# Altium footprint library ICL_komponenty_v1.PcbLib: 160 footprints (part 5 of 10) (continued)
## LQFP100_A001 [mm] "TSQFP, 100-Leads, Body 14,00x14,00mm, Pitch 0,50mm, IPC Low Density" (continued)
  region: -0.4,-7 -0.6,-7 -0.6,-8 -0.4,-8
  region: -0.9,-7 -1.1,-7 -1.1,-8 -0.9,-8
  region: -1.4,-7 -1.6,-7 -1.6,-8 -1.4,-8
  region: -1.9,-7 -2.1,-7 -2.1,-8 -1.9,-8
  region: -2.4,-7 -2.6,-7 -2.6,-8 -2.4,-8
  region: -2.9,-7 -3.1,-7 -3.1,-8 -2.9,-8
  region: -3.4,-7 -3.6,-7 -3.6,-8 -3.4,-8
  region: -3.9,-7 -4.1,-7 -4.1,-8 -3.9,-8
  region: -4.4,-7 -4.6,-7 -4.6,-8 -4.4,-8
  region: -4.9,-7 -5.1,-7 -5.1,-8 -4.9,-8
  region: -5.4,-7 -5.6,-7 -5.6,-8 -5.4,-8
  region: -5.9,-7 -6.1,-7 -6.1,-8 -5.9,-8
  region: -7,-6.1 -7,-5.9 -8,-5.9 -8,-6.1
  region: -7,-5.6 -7,-5.4 -8,-5.4 -8,-5.6
  region: -7,-5.1 -7,-4.9 -8,-4.9 -8,-5.1
  region: -7,-4.6 -7,-4.4 -8,-4.4 -8,-4.6
  region: -7,-4.1 -7,-3.9 -8,-3.9 -8,-4.1
  region: -7,-3.6 -7,-3.4 -8,-3.4 -8,-3.6
  region: -7,-3.1 -7,-2.9 -8,-2.9 -8,-3.1
  region: -7,-2.6 -7,-2.4 -8,-2.4 -8,-2.6
  region: -7,-2.1 -7,-1.9 -8,-1.9 -8,-2.1
  region: -7,-1.6 -7,-1.4 -8,-1.4 -8,-1.6
  region: -7,-1.1 -7,-0.9 -8,-0.9 -8,-1.1
  region: -7,-0.6 -7,-0.4 -8,-0.4 -8,-0.6
  region: -7,-0.1 -7,0.1 -8,0.1 -8,-0.1
  region: -7,0.4 -7,0.6 -8,0.6 -8,0.4
  region: -7,0.9 -7,1.1 -8,1.1 -8,0.9
  region: -7,1.4 -7,1.6 -8,1.6 -8,1.4
  region: -7,1.9 -7,2.1 -8,2.1 -8,1.9
  region: -7,2.4 -7,2.6 -8,2.6 -8,2.4
  region: -7,2.9 -7,3.1 -8,3.1 -8,2.9
  region: -7,3.4 -7,3.6 -8,3.6 -8,3.4
  region: -7,3.9 -7,4.1 -8,4.1 -8,3.9
  region: -7,4.4 -7,4.6 -8,4.6 -8,4.4
  region: -7,4.9 -7,5.1 -8,5.1 -8,4.9
  region: -7,5.4 -7,5.6 -8,5.6 -8,5.4
  region: -7,5.9 -7,6.1 -8,6.1 -8,5.9
  lines w0.2: -7,-7 7,-7 7,7 -7,7 -7,-7
Top M13-14_SDES:
  text "'.Designator'" at -8.497,-0.625 h1.5
Top M15-16_SORG:
  lines w0.1: -0.5,0 0.5,0 ; 0,-0.5 0,0.5 ; -9.15,-9.15 9.15,-9.15 9.15,9.15 -9.15,9.15 -9.15,-9.15
3D body "LQFP100_A001.step": height 1.6, standoff 0, extent -8,-8 8,8

## LQFP176 [mm]
height 1.6
pads (176):
  oval 1.5x0.3 smd: 1(-12.8,10.75) 2(-12.8,10.25) 3(-12.8,9.75) 4(-12.8,9.25) 5(-12.8,8.75) 6(-12.8,8.25) 7(-12.8,7.75) 8(-12.8,7.25) 9(-12.8,6.75) 10(-12.8,6.25) 11(-12.8,5.75) 12(-12.8,5.25) 13(-12.8,4.75) 14(-12.8,4.25) 15(-12.8,3.75) 16(-12.8,3.25) 17(-12.8,2.75) 18(-12.8,2.25) 19(-12.8,1.75) 20(-12.8,1.25) 21(-12.8,0.75) 22(-12.8,0.25) 23(-12.8,-0.25) 24(-12.8,-0.75) 25(-12.8,-1.25) 26(-12.8,-1.75) 27(-12.8,-2.25) 28(-12.8,-2.75) 29(-12.8,-3.25) 30(-12.8,-3.75) 31(-12.8,-4.25) 32(-12.8,-4.75) 33(-12.8,-5.25) 34(-12.8,-5.75) 35(-12.8,-6.25) 36(-12.8,-6.75) 37(-12.8,-7.25) 38(-12.8,-7.75) 39(-12.8,-8.25) 40(-12.8,-8.75) 41(-12.8,-9.25) 42(-12.8,-9.75) 43(-12.8,-10.25) 44(-12.8,-10.75) 89(12.8,-10.75) 90(12.8,-10.25) 91(12.8,-9.75) 92(12.8,-9.25) 93(12.8,-8.75) 94(12.8,-8.25) 95(12.8,-7.75) 96(12.8,-7.25) 97(12.8,-6.75) 98(12.8,-6.25) 99(12.8,-5.75) 100(12.8,-5.25) 101(12.8,-4.75) 102(12.8,-4.25) 103(12.8,-3.75) 104(12.8,-3.25) 105(12.8,-2.75) 106(12.8,-2.25) 107(12.8,-1.75) 108(12.8,-1.25) 109(12.8,-0.75) 110(12.8,-0.25) 111(12.8,0.25) 112(12.8,0.75) 113(12.8,1.25) 114(12.8,1.75) 115(12.8,2.25) 116(12.8,2.75) 117(12.8,3.25) 118(12.8,3.75) 119(12.8,4.25) 120(12.8,4.75) 121(12.8,5.25) 122(12.8,5.75) 123(12.8,6.25) 124(12.8,6.75) 125(12.8,7.25) 126(12.8,7.75) 127(12.8,8.25) 128(12.8,8.75) 129(12.8,9.25) 130(12.8,9.75) 131(12.8,10.25) 132(12.8,10.75)
  oval 0.3x1.5 smd: 45(-10.75,-12.8) 46(-10.25,-12.8) 47(-9.75,-12.8) 48(-9.25,-12.8) 49(-8.75,-12.8) 50(-8.25,-12.8) 51(-7.75,-12.8) 52(-7.25,-12.8) 53(-6.75,-12.8) 54(-6.25,-12.8) 55(-5.75,-12.8) 56(-5.25,-12.8) 57(-4.75,-12.8) 58(-4.25,-12.8) 59(-3.75,-12.8) 60(-3.25,-12.8) 61(-2.75,-12.8) 62(-2.25,-12.8) 63(-1.75,-12.8) 64(-1.25,-12.8) 65(-0.75,-12.8) 66(-0.25,-12.8) 67(0.25,-12.8) 68(0.75,-12.8) 69(1.25,-12.8) 70(1.75,-12.8) 71(2.25,-12.8) 72(2.75,-12.8) 73(3.25,-12.8) 74(3.75,-12.8) 75(4.25,-12.8) 76(4.75,-12.8) 77(5.25,-12.8) 78(5.75,-12.8) 79(6.25,-12.8) 80(6.75,-12.8) 81(7.25,-12.8) 82(7.75,-12.8) 83(8.25,-12.8) 84(8.75,-12.8) 85(9.25,-12.8) 86(9.75,-12.8) 87(10.25,-12.8) 88(10.75,-12.8) 133(10.75,12.8) 134(10.25,12.8) 135(9.75,12.8) 136(9.25,12.8) 137(8.75,12.8) 138(8.25,12.8) 139(7.75,12.8) 140(7.25,12.8) 141(6.75,12.8) 142(6.25,12.8) 143(5.75,12.8) 144(5.25,12.8) 145(4.75,12.8) 146(4.25,12.8) 147(3.75,12.8) 148(3.25,12.8) 149(2.75,12.8) 150(2.25,12.8) 151(1.75,12.8) 152(1.25,12.8) 153(0.75,12.8) 154(0.25,12.8) 155(-0.25,12.8) 156(-0.75,12.8) 157(-1.25,12.8) 158(-1.75,12.8) 159(-2.25,12.8) 160(-2.75,12.8) 161(-3.25,12.8) 162(-3.75,12.8) 163(-4.25,12.8) 164(-4.75,12.8) 165(-5.25,12.8) 166(-5.75,12.8) 167(-6.25,12.8) 168(-6.75,12.8) 169(-7.25,12.8) 170(-7.75,12.8) 171(-8.25,12.8) 172(-8.75,12.8) 173(-9.25,12.8) 174(-9.75,12.8) 175(-10.25,12.8) 176(-10.75,12.8)
Top Overlay:
  circle w0.25: c-12.8,11.45 r0.125
  circle w0.6: c-10.6,10.6 r0.3
  lines w0.2: -11.6,-11.6 -11.6,11.6 11.6,11.6 11.6,-11.6 -11.6,-11.6
Mechanical 3:
  lines w0.2: -1.7,0 0,0 ; 0,-1.7 0,0 ; 0,1.7 0,0 ; 1.7,0 0,0
Top M11-12_SMOT:
  drawing of 182 lines, arcs and shapes, not listed
Top M13-14_SDES:
  text "'.Designator'" at -11.33,-0.833 h2
Top M15-16_SORG:
  lines w0.05: -14.1,-14.1 -14.1,14.1 14.1,14.1 14.1,-14.1 -14.1,-14.1
  lines w0.1: -0.5,0 0.5,0 ; 0,-0.5 0,0.5
3D body "LQFP176_B.step": height 1.6, standoff 0, extent -13,-13 13,13

## LQFP-80 [mm] "TSQFP, 80-Leads, Body 12.00x12.00mm, Pitch 0.50mm, IPC Low Density"
height 1.2
pads (80):
  oval 1.6x0.35 smd: 1(-6.7,4.75) 2(-6.7,4.25) 3(-6.7,3.75) 4(-6.7,3.25) 5(-6.7,2.75) 6(-6.7,2.25) 7(-6.7,1.75) 8(-6.7,1.25) 9(-6.7,0.75) 10(-6.7,0.25) 11(-6.7,-0.25) 12(-6.7,-0.75) 13(-6.7,-1.25) 14(-6.7,-1.75) 15(-6.7,-2.25) 16(-6.7,-2.75) 17(-6.7,-3.25) 18(-6.7,-3.75) 19(-6.7,-4.25) 20(-6.7,-4.75) 41(6.7,-4.75) 42(6.7,-4.25) 43(6.7,-3.75) 44(6.7,-3.25) 45(6.7,-2.75) 46(6.7,-2.25) 47(6.7,-1.75) 48(6.7,-1.25) 49(6.7,-0.75) 50(6.7,-0.25) 51(6.7,0.25) 52(6.7,0.75) 53(6.7,1.25) 54(6.7,1.75) 55(6.7,2.25) 56(6.7,2.75) 57(6.7,3.25) 58(6.7,3.75) 59(6.7,4.25) 60(6.7,4.75)
  oval 0.35x1.6 smd: 21(-4.75,-6.7) 22(-4.25,-6.7) 23(-3.75,-6.7) 24(-3.25,-6.7) 25(-2.75,-6.7) 26(-2.25,-6.7) 27(-1.75,-6.7) 28(-1.25,-6.7) 29(-0.75,-6.7) 30(-0.25,-6.7) 31(0.25,-6.7) 32(0.75,-6.7) 33(1.25,-6.7) 34(1.75,-6.7) 35(2.25,-6.7) 36(2.75,-6.7) 37(3.25,-6.7) 38(3.75,-6.7) 39(4.25,-6.7) 40(4.75,-6.7) 61(4.75,6.7) 62(4.25,6.7) 63(3.75,6.7) 64(3.25,6.7) 65(2.75,6.7) 66(2.25,6.7) 67(1.75,6.7) 68(1.25,6.7) 69(0.75,6.7) 70(0.25,6.7) 71(-0.25,6.7) 72(-0.75,6.7) 73(-1.25,6.7) 74(-1.75,6.7) 75(-2.25,6.7) 76(-2.75,6.7) 77(-3.25,6.7) 78(-3.75,6.7) 79(-4.25,6.7) 80(-4.75,6.7)
Top Overlay:
  circle w0.25: c-6.7,5.475 r0.125
  lines w0.2: -5.6,-5.6 -5.6,5.6 5.6,5.6 5.6,-5.6 -5.6,-5.6
Top M11-12_SMOT:
  circle w0.6: c-4.6,4.6 r0.3
  rectangle: -4.9,5.8 -4.6,7
  rectangle: -4.4,5.8 -4.1,7
  rectangle: -3.9,5.8 -3.6,7
  rectangle: -3.4,5.8 -3.1,7
  rectangle: -2.9,5.8 -2.6,7
  rectangle: -2.4,5.8 -2.1,7
  rectangle: -1.9,5.8 -1.6,7
  rectangle: -1.4,5.8 -1.1,7
  rectangle: -0.9,5.8 -0.6,7
  rectangle: -0.4,5.8 -0.1,7
  rectangle: 0.1,5.8 0.4,7
  rectangle: 0.6,5.8 0.9,7
  rectangle: 1.1,5.8 1.4,7
  rectangle: 1.6,5.8 1.9,7
  rectangle: 2.1,5.8 2.4,7
  rectangle: 2.6,5.8 2.9,7
  rectangle: 3.1,5.8 3.4,7
  rectangle: 3.6,5.8 3.9,7
  rectangle: 4.1,5.8 4.4,7
  rectangle: 4.6,5.8 4.9,7
  region: -5.8,-4.9 -5.8,-4.6 -7,-4.6 -7,-4.9
  region: -5.8,-4.4 -5.8,-4.1 -7,-4.1 -7,-4.4
  region: -5.8,-3.9 -5.8,-3.6 -7,-3.6 -7,-3.9
  region: -5.8,-3.4 -5.8,-3.1 -7,-3.1 -7,-3.4
  region: -5.8,-2.9 -5.8,-2.6 -7,-2.6 -7,-2.9
  region: -5.8,-2.4 -5.8,-2.1 -7,-2.1 -7,-2.4
  region: -5.8,-1.9 -5.8,-1.6 -7,-1.6 -7,-1.9
  region: -5.8,-1.4 -5.8,-1.1 -7,-1.1 -7,-1.4
  region: -5.8,-0.9 -5.8,-0.6 -7,-0.6 -7,-0.9
  region: -5.8,-0.4 -5.8,-0.1 -7,-0.1 -7,-0.4
  region: -5.8,0.1 -5.8,0.4 -7,0.4 -7,0.1
  region: -5.8,0.6 -5.8,0.9 -7,0.9 -7,0.6
  region: -5.8,1.1 -5.8,1.4 -7,1.4 -7,1.1
  region: -5.8,1.6 -5.8,1.9 -7,1.9 -7,1.6
  region: -5.8,2.1 -5.8,2.4 -7,2.4 -7,2.1
  region: -5.8,2.6 -5.8,2.9 -7,2.9 -7,2.6
  region: -5.8,3.1 -5.8,3.4 -7,3.4 -7,3.1
  region: -5.8,3.6 -5.8,3.9 -7,3.9 -7,3.6
  region: -5.8,4.1 -5.8,4.4 -7,4.4 -7,4.1
  region: -5.8,4.6 -5.8,4.9 -7,4.9 -7,4.6
  region: 4.9,-5.8 4.6,-5.8 4.6,-7 4.9,-7
  region: 4.4,-5.8 4.1,-5.8 4.1,-7 4.4,-7
  region: 3.9,-5.8 3.6,-5.8 3.6,-7 3.9,-7
  region: 3.4,-5.8 3.1,-5.8 3.1,-7 3.4,-7
  region: 2.9,-5.8 2.6,-5.8 2.6,-7 2.9,-7
  region: 2.4,-5.8 2.1,-5.8 2.1,-7 2.4,-7
  region: 1.9,-5.8 1.6,-5.8 1.6,-7 1.9,-7
  region: 1.4,-5.8 1.1,-5.8 1.1,-7 1.4,-7
  region: 0.9,-5.8 0.6,-5.8 0.6,-7 0.9,-7
  region: 0.4,-5.8 0.1,-5.8 0.1,-7 0.4,-7
  region: -0.1,-5.8 -0.4,-5.8 -0.4,-7 -0.1,-7
  region: -0.6,-5.8 -0.9,-5.8 -0.9,-7 -0.6,-7
  region: -1.1,-5.8 -1.4,-5.8 -1.4,-7 -1.1,-7
  region: -1.6,-5.8 -1.9,-5.8 -1.9,-7 -1.6,-7
  region: -2.1,-5.8 -2.4,-5.8 -2.4,-7 -2.1,-7
  region: -2.6,-5.8 -2.9,-5.8 -2.9,-7 -2.6,-7
  region: -3.1,-5.8 -3.4,-5.8 -3.4,-7 -3.1,-7
  region: -3.6,-5.8 -3.9,-5.8 -3.9,-7 -3.6,-7
  region: -4.1,-5.8 -4.4,-5.8 -4.4,-7 -4.1,-7
  region: -4.6,-5.8 -4.9,-5.8 -4.9,-7 -4.6,-7
  region: 5.8,4.9 5.8,4.6 7,4.6 7,4.9
  region: 5.8,4.4 5.8,4.1 7,4.1 7,4.4
  region: 5.8,3.9 5.8,3.6 7,3.6 7,3.9
  region: 5.8,3.4 5.8,3.1 7,3.1 7,3.4
  region: 5.8,2.9 5.8,2.6 7,2.6 7,2.9
  region: 5.8,2.4 5.8,2.1 7,2.1 7,2.4
  region: 5.8,1.9 5.8,1.6 7,1.6 7,1.9
  region: 5.8,1.4 5.8,1.1 7,1.1 7,1.4
  region: 5.8,0.9 5.8,0.6 7,0.6 7,0.9
  region: 5.8,0.4 5.8,0.1 7,0.1 7,0.4
  region: 5.8,-0.1 5.8,-0.4 7,-0.4 7,-0.1
  region: 5.8,-0.6 5.8,-0.9 7,-0.9 7,-0.6
  region: 5.8,-1.1 5.8,-1.4 7,-1.4 7,-1.1
  region: 5.8,-1.6 5.8,-1.9 7,-1.9 7,-1.6
  region: 5.8,-2.1 5.8,-2.4 7,-2.4 7,-2.1
  region: 5.8,-2.6 5.8,-2.9 7,-2.9 7,-2.6
  region: 5.8,-3.1 5.8,-3.4 7,-3.4 7,-3.1
  region: 5.8,-3.6 5.8,-3.9 7,-3.9 7,-3.6
  region: 5.8,-4.1 5.8,-4.4 7,-4.4 7,-4.1
  region: 5.8,-4.6 5.8,-4.9 7,-4.9 7,-4.6
  lines w0.2: -5.8,-5.8 5.8,-5.8 5.8,5.8 -5.8,5.8 -5.8,-5.8
Top M13-14_SDES:
  text "'.Designator'" at -7.931,-0.583 h1.4
Top M15-16_SORG:
  lines w0.05: -7.7,-7.7 -7.7,7.7 7.7,7.7 7.7,-7.7 -7.7,-7.7
  lines w0.1: -0.5,0 0.5,0 ; 0,-0.5 0,0.5
3D body "TSQFP80.step": height 1.2, standoff 0, extent -7,-7 7,7

## M66 [mm]
pads (44):
  rect 2.5x0.7 smd mask+0.1: 1(-7.65,6.6) 2(-7.65,5.5) 3(-7.65,4.4) 4(-7.65,3.3) 5(-7.65,2.2) 6(-7.65,1.1) 7(-7.65,0) 8(-7.65,-1.1) 9(-7.65,-2.2) 10(-7.65,-3.3) 11(-7.65,-4.4) 12(-7.65,-5.5) 13(-7.65,-6.6) 23(7.65,-6.6) 24(7.65,-5.5) 25(7.65,-4.4) 26(7.65,-3.3) 27(7.65,-2.2) 28(7.65,-1.1) 29(7.65,0) 30(7.65,1.1) 31(7.65,2.2) 32(7.65,3.3) 33(7.65,4.4) 34(7.65,5.5) 35(7.65,6.6)
  rect 0.7x2.5 smd mask+0.1: 14(-4.4,-8.6) 15(-3.3,-8.6) 16(-2.2,-8.6) 17(-1.1,-8.6) 18(0,-8.6) 19(1.1,-8.6) 20(2.2,-8.6) 21(3.3,-8.6) 22(4.4,-8.6) 36(4.4,8.6) 37(3.3,8.6) 38(2.2,8.6) 39(1.1,8.6) 40(0,8.6) 41(-1.1,8.6) 42(-2.2,8.6) 43(-3.3,8.6) 44(-4.4,8.6)
Top Layer keep-out:
  circle w0.254: c4.25,5.15 r1.75
  circle w0.254: c4.25,-3.45 r1.75
Top Overlay:
  circle w0.6: c-9,8.8 r0.3
  lines w0.2: -7.9,-8 -7.9,-8.9 -7,-8.9 ; -7.9,8 -7.9,8.9 -7,8.9 ; 7,-8.9 7.9,-8.9 7.9,-8 ; 7,8.9 7.9,8.9 7.9,8
Top M11-12_SMOT:
  circle w0.6: c-6.55,8 r0.4
  region: -6.6,-6.3 -8,-6.3 -8,-6.9 -6.6,-6.9
  region: -6.6,-5.2 -8,-5.2 -8,-5.8 -6.6,-5.8
  region: -6.6,-4.1 -8,-4.1 -8,-4.7 -6.6,-4.7
  region: -6.6,-3 -8,-3 -8,-3.6 -6.6,-3.6
  region: -6.6,-0.8 -8,-0.8 -8,-1.4 -6.6,-1.4
  region: -6.6,1.4 -8,1.4 -8,0.8 -6.6,0.8
  region: -6.6,3.6 -8,3.6 -8,3 -6.6,3
  region: -6.6,4.7 -8,4.7 -8,4.1 -6.6,4.1
  region: -6.6,5.8 -8,5.8 -8,5.2 -6.6,5.2
  region: -6.6,6.9 -8,6.9 -8,6.3 -6.6,6.3
  rectangle: 6.6,-6.9 8,-6.3
  rectangle: 6.6,-4.7 8,-4.1
  rectangle: 6.6,-5.8 8,-5.2
  rectangle: 6.6,-3.6 8,-3
  rectangle: 6.6,-1.4 8,-0.8
  rectangle: 6.6,0.8 8,1.4
  rectangle: 6.6,3 8,3.6
  rectangle: 6.6,5.2 8,5.8
  rectangle: 6.6,4.1 8,4.7
  rectangle: 6.6,6.3 8,6.9
  region: -6.6,-1.9 -8,-1.9 -8,-2.5 -6.6,-2.5
  region: -6.6,0.3 -8,0.3 -8,-0.3 -6.6,-0.3
  region: -6.6,2.5 -8,2.5 -8,1.9 -6.6,1.9
  region: -4.7,-7.55 -4.7,-8.95 -4.1,-8.95 -4.1,-7.55
  region: -4.1,7.55 -4.1,8.95 -4.7,8.95 -4.7,7.55
  region: -3.6,-7.55 -3.6,-8.95 -3,-8.95 -3,-7.55
  region: -3,7.55 -3,8.95 -3.6,8.95 -3.6,7.55
  region: -1.4,-7.55 -1.4,-8.95 -0.8,-8.95 -0.8,-7.55
  region: -0.8,7.55 -0.8,8.95 -1.4,8.95 -1.4,7.55
  region: 0.8,-7.55 0.8,-8.95 1.4,-8.95 1.4,-7.55
  region: 1.4,7.55 1.4,8.95 0.8,8.95 0.8,7.55
  region: 3,-7.55 3,-8.95 3.6,-8.95 3.6,-7.55
  region: 3.6,7.55 3.6,8.95 3,8.95 3,7.55
  region: 4.1,-7.55 4.1,-8.95 4.7,-8.95 4.7,-7.55
  region: 4.7,7.55 4.7,8.95 4.1,8.95 4.1,7.55
  rectangle: 6.6,-2.5 8,-1.9
  rectangle: 6.6,1.9 8,2.5
  rectangle: 6.6,-0.3 8,0.3
  region: -2.5,-7.55 -2.5,-8.95 -1.9,-8.95 -1.9,-7.55
  region: -1.9,7.55 -1.9,8.95 -2.5,8.95 -2.5,7.55
  region: 1.9,-7.55 1.9,-8.95 2.5,-8.95 2.5,-7.55
  region: -0.3,-7.55 -0.3,-8.95 0.3,-8.95 0.3,-7.55
  region: 0.3,7.55 0.3,8.95 -0.3,8.95 -0.3,7.55
  region: 2.5,7.55 2.5,8.95 1.9,8.95 1.9,7.55
  lines w0.1: -7.9,-8.9 -7.9,8.9 7.9,8.9 7.9,-8.9 -7.9,-8.9
Top M13-14_SDES:
  text "'.Designator'" at -0.583,7.931 h1.4
Top M15-16_SORG:
  lines w0.2: -2.75,0 0,0 ; 0,-2.75 0,0 ; 0,2.75 0,0 ; 2.75,0 0,0 ; -9,-9.95 9,-9.95 9,9.9 -9,9.9 -9,-9.95
3D body "m66_3d_v2.STEP": height 2.3, standoff 0, extent -7.9,-8.85 7.9,8.85

## MBFL [mm] "Bridge rectifier"
pads (4):
  oval 1.6x0.6 smd: 1(-3,1.25)
  rect 1.6x0.6 smd: 2(-3,-1.25) 3(3,1.25) 4(3,-1.25)
Top Overlay:
  circle w0.25: c-0.889,2.032 r0.1
  circle w0.25: c-3.048,2.794 r0.1
  lines w0.152: -1.397,-2.54 -1.397,2.54 1.397,2.54 1.397,-2.54 -1.397,-2.54
Top M11-12_SMOT:
  rectangle: -3.5,1 -2.3,1.5
  rectangle: -3.5,-1.5 -2.3,-1
  region: 3.6,1.5 2.3,1.5 2.3,1 3.6,1
  region: 3.6,-1 2.3,-1 2.3,-1.5 3.6,-1.5
  lines w0.15: -1.939,-2.5 -1.939,2.5 ; -2.3,-2.5 -2.3,2.5 2.3,2.5 2.3,-2.5 -2.3,-2.5
  text "~" at 1.25,-2.283 h1
  text "~" at 1.15,0.117 h1
  text "-" at -1.55,-1.75 h1
  text "+" at -1.55,0.783 h1
Top M13-14_SDES:
  text "'.Designator'" at 0.517,-5.665 h1
Top M15-16_SORG:
  lines w0.15: -1,0 0,0 ; 0,-1 0,0 ; 0,1 0,0 ; 1,0 0,0
  lines w0.2: -4.1,-2.7 4.1,-2.7 4.1,2.7 -4.1,2.7 -4.1,-2.7
3D body: height 2.7, standoff 0, extent -2.3,-2.5 2.3,2.5

## MEMS_OSC_2.5_3-2_2.5_v1 [mm] "mems oscilator 2.5x2 or 3.2x2.5"
pads (4):
  rect 1.3x1 smd: 1(-1,-0.9) 2(1,-0.9) 3(1,0.9) 4(-1,0.9)
Top Overlay:
  circle w0.4: c-2,-2 r0.2
  lines w0.2: -1.3,-1.8 1.3,-1.8 ; -1.3,1.8 1.3,1.8
Top M11-12_SMOT:
  circle w0.3: c-2,-0.85 r0.1
  rectangle: -1.65,-1.3 -0.6,-0.6
  rectangle: 0.55,-1.3 1.6,-0.6
  rectangle: 0.55,0.6 1.6,1.3
  rectangle: -1.6,0.6 -0.55,1.3
  lines w0.1: -1.6,-1.3 1.6,-1.3 1.6,1.3 -1.6,1.3 -1.6,-1.3
Top M13-14_SDES:
  text "'.Designator'" at -3.449,2.2 h0.6
Top M15-16_SORG:
  lines w0.1: -0.798,-0.002 0.002,-0.002 ; -0.002,-0.002 0.798,-0.002 ; 0,-0.802 0,-0.002 ; 0,0 0,0.8 ; -1.6,-1.3 1.6,-1.3 1.6,1.3 -1.6,1.3 -1.6,-1.3 ; -1.3,-1 1.3,-1 1.3,1 -1.3,1 -1.3,-1 ; -1,-0.802 1,-0.802 1,0.8 -1,0.8 -1,-0.802
3D body: height 0.8, standoff 0, extent -1.508,-1.3 1.511,1.3
3D body: height 0.8, standoff 0, extent 1.506,0.58 1.55,1.127
3D body: height 0.8, standoff 0, extent 1.506,-1.22 1.55,-0.673
3D body: height 0.8, standoff 0, extent -1.55,0.673 -1.506,1.22
3D body: height 0.81, standoff 0.8, extent -1.298,-1.101 -0.7,-0.502
3D body: height 0.8, standoff 0, extent -1.55,-1.127 -1.506,-0.58

## microMELF [mm] "MELF Diode, 2-Leads, Body 1,90x1,15mm, IPC Medium Density"
height 1.1
pads (2):
  rect 0.8x1.3 smd: 1(0.9,0) 2(-0.9,0)
Top Overlay:
  rectangle: -0.255,-0.624 -0.005,0.626
  lines w0.2: 0.183,-0.625 -0.161,-0.625 -0.161,0.625 0.194,0.625
Top M11-12_SMOT:
  rectangle: -0.891,-0.55 -0.639,0.55
  region: -1.105,0.55 -1.3,0.55 -1.3,-0.55 -1.105,-0.55
  rectangle: 1.105,-0.55 1.3,0.55
  lines w0.1: -1.3,-0.55 -1.3,0.55 1.3,0.55 1.3,-0.55 -1.3,-0.55
Top M13-14_SDES:
  text "'.Designator'" at -3.065,-0.192 h0.7
Top M15-16_SORG:
  lines w0.05: -1.5,-0.9 1.5,-0.9 1.5,0.9 -1.5,0.9 -1.5,-0.9
  lines w0.1: -0.5,0 0.5,0 ; 0,-0.5 0,0.5
3D body "microMELF.step": height 1.15, standoff 0, extent -0.95,-0.574 0.95,0.574

## Mini-Flat_4 [mm]
pads (4):
  rect 1.5x0.8 smd: 1(-3.15,1.27) 2(-3.15,-1.27) 3(3.15,-1.27) 4(3.15,1.27)
Top Overlay:
  circle w0.508: c-1.245,1.194 r0.114
  circle w0.508: c-3.175,2.362 r0.105
  lines w0.152: -1.829,-1.8 -1.829,1.8 1.727,1.8 1.727,-1.8 -1.829,-1.8
Top M11-12_SMOT:
  circle w0.508: c-1.3,1.2 r0.114
  region: 3.5,1.587 1.8,1.587 1.8,0.94 3.5,0.94
  region: 3.5,-0.953 1.8,-0.953 1.8,-1.6 3.5,-1.6
  rectangle: -3.5,0.953 -1.8,1.6
  rectangle: -3.5,-1.587 -1.8,-0.94
  lines w0.1: -1.8,-1.8 1.8,-1.8 1.8,1.8 -1.8,1.8 -1.8,-1.8
Top M13-14_SDES:
  text "'.Designator'" at -4.532,-0.333 h0.8
Top M15-16_SORG:
  lines w0.15: -1.194,0 0,0 ; 0,-1.194 0,0 ; 0,1.194 0,0 ; 1.194,0 0,0 ; -4.2,-2.1 4.2,-2.1 4.2,2.1 -4.2,2.1 -4.2,-2.1
3D body "Mini-FlatPackage_4.STEP": height 2, standoff -0.1, extent -3.525,-1.8 3.475,1.8

## Mini-Flat_4_10mm [mm] "10mm version"
pads (4):
  rect 3x0.8 smd: 1(-4.5,1.27) 2(-4.5,-1.27) 3(4.5,-1.27) 4(4.5,1.27)
Top Overlay:
  circle w0.508: c-1.25,1.95 r0.114
  circle w0.508: c-3.3,2.35 r0.105
  lines w0.152: -1.829,-2.5 -1.829,2.5 1.727,2.5 1.727,-2.5 -1.829,-2.5
Top M11-12_SMOT:
  circle w0.508: c-1.9,1.3 r0.114
  region: 4.1,1.597 2.4,1.597 2.4,0.95 4.1,0.95
  region: 4.1,-0.953 2.4,-0.953 2.4,-1.6 4.1,-1.6
  rectangle: -4.15,0.95 -2.45,1.597
  rectangle: -4.15,-1.6 -2.45,-0.953
  lines w0.1: -2.45,-2.45 2.45,-2.45 2.45,2.45 -2.45,2.45 -2.45,-2.45
Top M13-14_SDES:
  text "'.Designator'" at -4.532,-0.333 h0.8
Top M15-16_SORG:
  lines w0.15: -1.194,0 0,0 ; 0,-1.194 0,0 ; 0,1.194 0,0 ; 1.194,0 0,0 ; -6.25,-2.55 6.25,-2.55 6.25,2.55 -6.25,2.55 -6.25,-2.55
3D body "Mini-FlatPackage_4.STEP": height 2, standoff -0.1, extent -3.525,-1.8 3.475,1.8

## MINIMELF [mm]
pads (2):
  rect 1x1.75 smd: 1(1.75,0) 2(-1.75,0)
Top Overlay:
  circle w0.25: c-2.667,0 r0.1
  rectangle: -1.016,-0.762 -0.508,0.762
  rectangle: -0.508,0.635 0.889,0.762
  rectangle: -0.508,-0.762 0.889,-0.635
Top M11-12_SMOT:
  rectangle: -1.2,-0.7 -0.848,0.7
  region: -1.604,0.699 -1.799,0.699 -1.799,-0.7 -1.604,-0.7
  rectangle: 1.6,-0.7 1.795,0.7
  lines w0.1: -1.8,-0.7 -1.8,0.7 1.8,0.7 1.8,-0.7 -1.8,-0.7
Top M13-14_SDES:
  text "'.Designator'" at -4.532,-0.233 h0.8
Top M15-16_SORG:
  lines w0.1: -0.6,0 0,0 ; 0,-0.6 0,0 ; 0,0.6 0,0 ; 0.6,0 0,0 ; -2.4,-1 -2.4,1 -0.3,1 2.4,1 2.4,-1 -2.4,-1
3D body "minimelf.step": height 1.4, standoff 0, extent -1.725,-0.686 1.775,0.714

## MPFxxxxXT-1W [mm] "MPF MPB isolated DC-DC converter"
pads (5):
  rect 1x2.5 smd mask+0: 1(-3.81,-5.3) 2(-1.27,-5.3) 4(3.81,-5.3) 5(3.81,5.3) 8(-3.81,5.3)
Top Overlay:
  lines w0.2: -5.1,-5.6 -6.4,-5.6 -6.4,-2.825 -5.9,-2.325 -5.9,2.225 -6.4,2.725 -6.4,5.5 -5.1,5.5 ; -2.9,-5.6 -2.2,-5.6 ; -2.6,5.5 2.7,5.5 ; -0.2,-5.6 2.8,-5.6 ; 4.9,-5.6 6.4,-5.6 6.4,5.5 4.9,5.5
Top M11-12_SMOT:
  circle w0.3: c-5.3,-4 r0.6
  region: -4.12,-5.5 -4.12,-6.3 -3.52,-6.3 -3.52,-5.5
  region: -1.58,-5.5 -1.58,-6.3 -0.98,-6.3 -0.98,-5.5
  region: 3.5,-5.5 3.5,-6.3 4.1,-6.3 4.1,-5.5
  region: 4.12,5.5 4.12,6.3 3.52,6.3 3.52,5.5
  region: -3.5,5.5 -3.5,6.3 -4.1,6.3 -4.1,5.5
  lines w0.2: -6.4,-5.6 -6.4,-2.825 -5.9,-2.325 -5.9,2.225 -6.4,2.725 -6.4,5.5 6.4,5.5 6.4,-5.6 -6.4,-5.6
Top M13-14_SDES:
  text "'.Designator'" at -5.665,-0.417 h1
Top M15-16_SORG:
  lines w0.1: -1.5,0 1.5,0 ; 0,-1.5 0,1.5 ; -6.5,-6.6 6.5,-6.6 6.5,6.7 -6.5,6.7 -6.5,-6.6
3D body "RECOM_R1S-xxxx.step": height 7.01, standoff 0.01, extent -6.375,-5.55 6.375,5.55

## MSOP-10-WCH [mm] "MSOP-10-WCH"
height 1.1
pads (10):
  oval 1.35x0.3 smd mask+0.1: 1(-2.225,1) 2(-2.225,0.5) 3(-2.225,0) 4(-2.225,-0.5) 5(-2.225,-1) 6(2.225,-1) 7(2.225,-0.5) 8(2.225,0) 9(2.225,0.5) 10(2.225,1)
Top Overlay:
  circle w0.25: c-0.495,0.937 r0.125
  lines w0.2: -1.15,-1.525 -1.15,1.525 1.15,1.525 1.15,-1.525 -1.15,-1.525
Top Solder:
  rectangle: 1.45,-1 3,1.003
  rectangle: -3,-1 -1.45,1.003
Top M11-12_SMOT:
  circle w0.15: c-0.9,1.1 r0.2
  region: 2.4,1.1 1.3,1.1 1.3,0.9 2.4,0.9
  region: 2.4,0.6 1.3,0.6 1.3,0.4 2.4,0.4
  region: 2.4,0.1 1.3,0.1 1.3,-0.1 2.4,-0.1
  region: 2.4,-0.4 1.3,-0.4 1.3,-0.6 2.4,-0.6
  region: 2.4,-0.9 1.3,-0.9 1.3,-1.1 2.4,-1.1
  rectangle: -2.4,-1.1 -1.3,-0.9
  rectangle: -2.4,-0.6 -1.3,-0.4
  rectangle: -2.4,-0.1 -1.3,0.1
  rectangle: -2.4,0.4 -1.3,0.6
  rectangle: -2.4,0.9 -1.3,1.1
  lines w0.1: -1.3,-1.5 -1.3,1.5 1.3,1.5 1.3,-1.5 -1.3,-1.5
Top M13-14_SDES:
  text "'.Designator'" at -3.399,-0.25 h0.6
Top M15-16_SORG:
  lines w0.05: -3.125,-1.8 -3.125,1.8 3.125,1.8 3.125,-1.8 -3.125,-1.8
  lines w0.1: -0.5,0 0.5,0 ; 0,-0.5 0,0.5
3D body "MSOP-10-WCH.step": height 1.1, standoff 0, extent -2.45,-1.55 2.45,1.55

## pDIP-8C [mm] "Power Integration DIP8"
pads (7):
  oval 1.4x1.8 hole 0.9: 1(-3.81,-3.81) 2(-1.27,-3.81) 4(3.81,-3.81) 5(3.81,3.81) 6(1.27,3.81) 7(-1.27,3.81) 8(-3.81,3.81)
Top Overlay:
  circle w0.254: c-4.3,-2.3 r0.141
  lines w0.2: -4.9,-3.9 -5.2,-3.9 -5.2,-1.9 -4.8,-1.5 -4.8,1.5 -5.2,1.9 -5.2,3.8 -4.9,3.8 ; -2.82,3.8 -2.32,3.8 ; -2.8,-3.9 -2.3,-3.9 ; -0.28,3.8 0.22,3.8 ; -0.2,-3.9 2.844,-3.9 ; 2.26,3.8 2.76,3.8 ; 4.9,-3.9 5.2,-3.9 5.2,1.1 5.2,3.8 4.9,3.8
Top M17-18_TDES:
  text "'.Designator'" at -4.432,1.967 h0.8
Top M19-20_TMOT:
  circle w0.254: c-4.2,-2.5 r0.141
  rectangle: -4.172,-4.1 -3.472,-3.3
  rectangle: -1.632,-4.1 -0.932,-3.3
  rectangle: 3.448,-4.1 4.148,-3.3
  region: 4.172,4.1 3.472,4.1 3.472,3.3 4.172,3.3
  region: 1.632,4.1 0.932,4.1 0.932,3.3 1.632,3.3
  region: -0.908,4.1 -1.608,4.1 -1.608,3.3 -0.908,3.3
  region: -3.448,4.1 -4.148,4.1 -4.148,3.3 -3.448,3.3
  lines w0.2: -4.9,-0.8 ccw(c-4.9,0) -4.9,0.8 ; -4.9,-3.3 -4.9,3.3 4.9,3.3 4.9,-3.3 -4.9,-3.3
Top M25-26_TORG:
  lines w0.2: -1.6,0 0,0 ; 0,-1.6 0,0 ; 0,1.6 0,0 ; 1.6,0 0,0 ; -5,-4.9 5,-4.9 5,4.9 -5,4.9 -5,-4.9
3D body "DIP-8 for TNY-1.step": height 4.36, standoff -3, extent -4.7,-3.935 4.7,3.935